# Altium footprint library cool_library.PcbLib: 1182 footprints (part 20 of 75)
Each footprint in its own frame and in the unit in brackets; x right, y up, seen from the top. Pads: shape width x height; smd on the part's side, far side on the other; paste and mask are expansions set on the pad; w line width, h text height; cw(c..) or ccw(c..) is an arc to the next point about the centre after c.
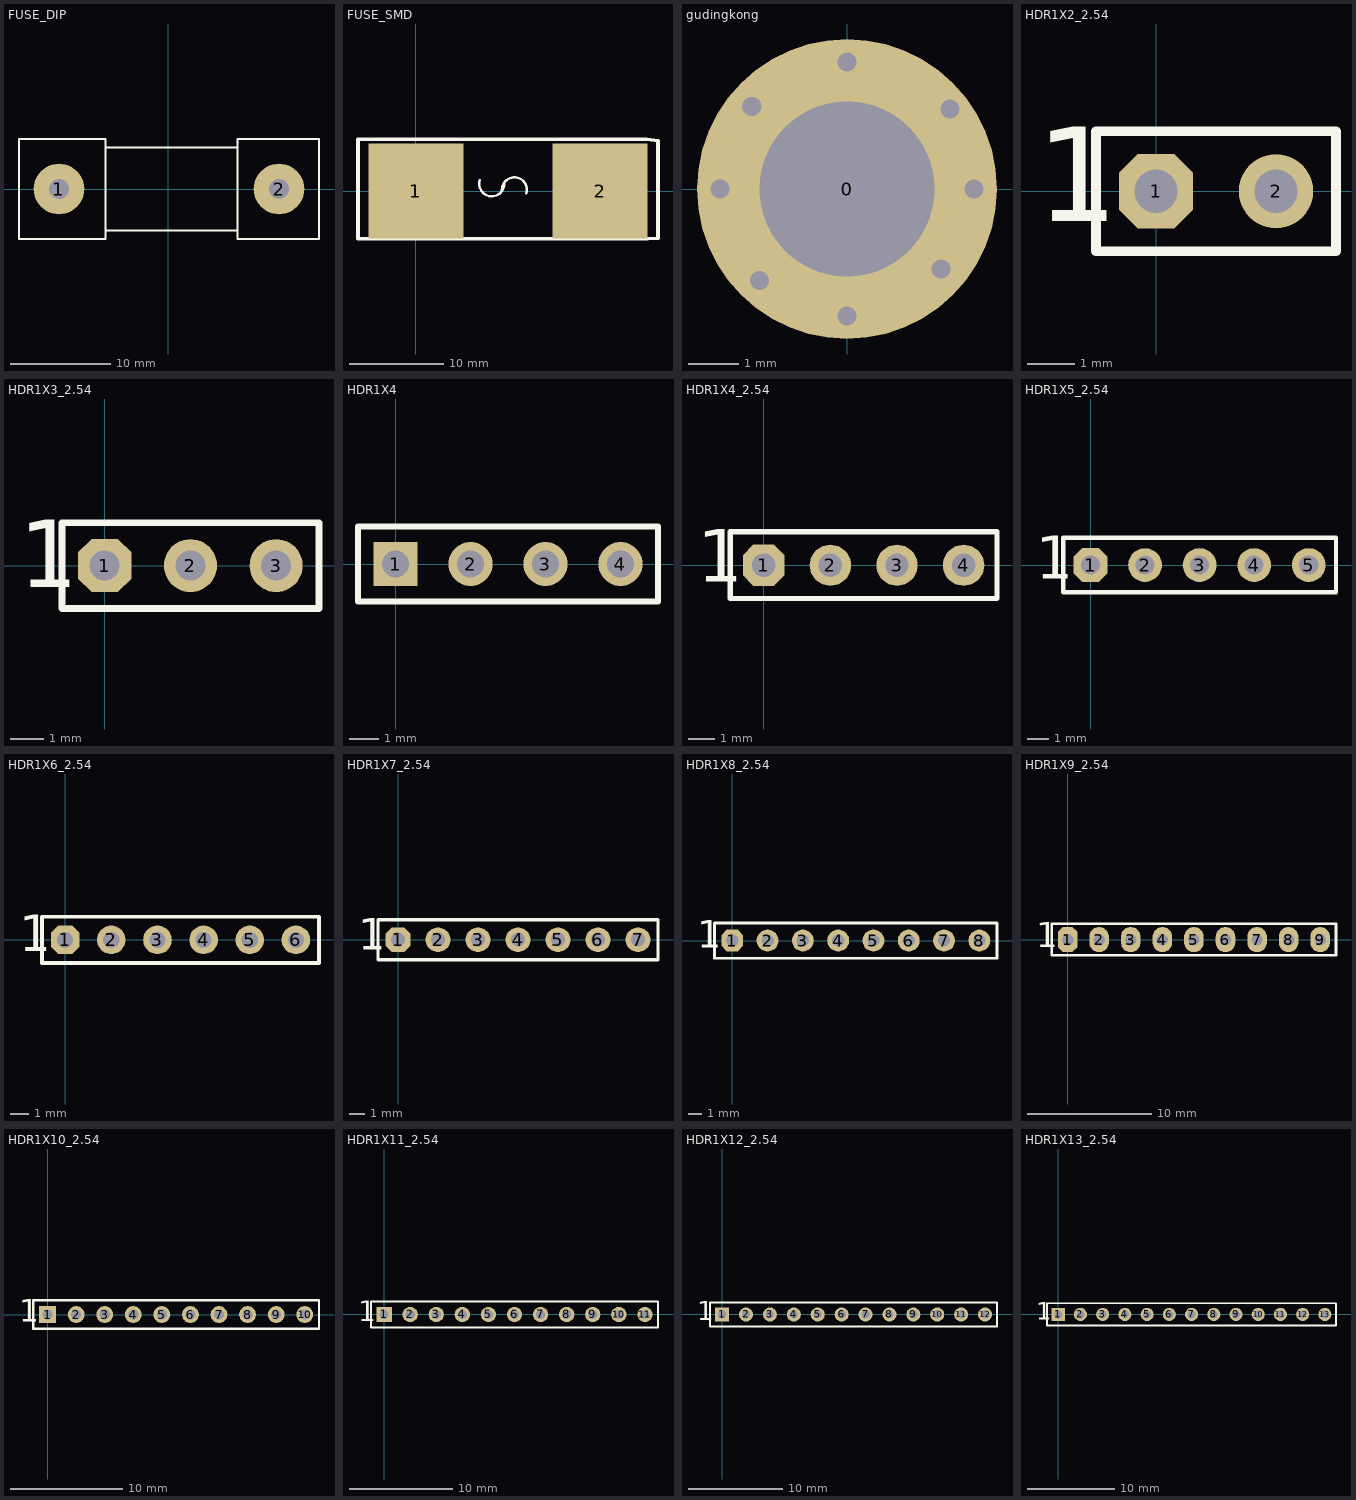
[diagram p19: the footprints below, top view; thin cyan lines are the x and y axes]

## FUSE_DIP [mm]
pads (2):
  round 5.08 hole 2: 1(-10.922,0) 2(11.078,0)
Top Overlay:
  lines w0.203: -6.286,-4.136 6.922,-4.136 ; -6.286,4.136 6.922,4.136 ; -14.922,-5 -6.286,-5 -6.286,5 -14.922,5 -14.922,-5 ; 6.922,-5 15.078,-5 15.078,5 6.922,5 6.922,-5

## FUSE_SMD [mm]
pads (2):
  rect 10x10 smd: 1(0,0) 2(19.431,0)
Top Overlay:
  lines w0.254: 6.734,1.149 ccw(c7.999,0.762) 9.322,0.762 ; 9.068,0.127 cw(c10.391,0.127) 11.656,-0.26
  lines w0.381: -6.121,5.461 24.384,5.461 25.552,5.309 25.552,-4.978 24.46,-5.055 -6.121,-5.055 -6.121,5.486

## gudingkong [mm]
pads (1):
  round 6 hole 3.5: 0(0,0)
via 0,2.54 diameter 0.762 hole 0.381
via 0,-2.54 diameter 0.762 hole 0.381
via -2.54,0 diameter 0.762 hole 0.381
via 2.54,0 diameter 0.762 hole 0.381
via -1.905,1.651 diameter 0.762 hole 0.381
via 2.057,1.6 diameter 0.762 hole 0.381
via -1.753,-1.829 diameter 0.762 hole 0.381
via 1.88,-1.6 diameter 0.762 hole 0.381

## HDR1X2_2.54 [mil]
pads (2):
  oct 62x62 hole 36: 1(0,0)
  round 62 hole 36: 2(100,0)
Top Overlay:
  lines w8: -50,-50 150,-50 150,50 -50,50 -50,-50
  text "1" at -100,-25 h78.74

## HDR1X3_2.54 [mil]
pads (3):
  oct 62x62 hole 35: 1(0,0)
  round 62 hole 35: 2(100,0) 3(200,0)
Top Overlay:
  lines w8: -50,-50 -50,50 250,50 250,-50 -50,-50
  text "1" at -100,-25 h78.74

## HDR1X4 [mm] "Connector; Header; 4 Position"
pads (4):
  rect 1.5x1.5 hole 0.9: 1(0,0)
  round 1.5 hole 0.9: 2(2.54,0) 3(5.08,0) 4(7.62,0)
Top Overlay:
  lines w0.2: -1.27,-1.27 -1.27,1.27 8.89,1.27 8.89,-1.27 -1.27,-1.27

## HDR1X4_2.54 [mil]
pads (4):
  oct 62x62 hole 35: 1(0,0)
  round 62 hole 35: 2(100,0) 3(200,0) 4(300,0)
Top Overlay:
  lines w8: -50,-50 -50,50 350,50 350,-50 -50,-50
  text "1" at -100,-25 h78.74

## HDR1X5_2.54 [mil]
pads (5):
  oct 62x62 hole 35: 1(0,0)
  round 62 hole 35: 2(100,0) 3(200,0) 4(300,0) 5(400,0)
Top Overlay:
  lines w8: -50,-50 -50,50 450,50 450,-50 -50,-50
  text "1" at -100,-25 h78.74

## HDR1X6_2.54 [mil]
pads (6):
  oct 62x62 hole 35: 1(0,0)
  round 62 hole 35: 2(100,0) 3(200,0) 4(300,0) 5(400,0) 6(500,0)
Top Overlay:
  lines w8: -50,-50 -50,50 550,50 550,-50 -50,-50
  text "1" at -100,-25 h78.74

## HDR1X7_2.54 [mil]
pads (7):
  oct 62x62 hole 35: 1(0,0)
  round 62 hole 35: 2(100,0) 3(200,0) 4(300,0) 5(400,0) 6(500,0) 7(600,0)
Top Overlay:
  lines w8: -50,-50 650,-50 650,50 -50,50 -50,-50
  text "1" at -100,-25 h78.74

## HDR1X8_2.54 [mil]
pads (8):
  oct 62x62 hole 35: 1(0,0)
  round 62 hole 35: 2(100,0) 3(200,0) 4(300,0) 5(400,0) 6(500,0) 7(600,0) 8(700,0)
Top Overlay:
  lines w8: -50,-50 750,-50 750,50 -50,50 -50,-50
  text "1" at -100,-20 h78.74

## HDR1X9_2.54 [mil]
pads (9):
  oct 62x80 hole 36: 1(0,0)
  oval 62x80 hole 36: 2(100,0) 3(200,0) 4(300,0) 5(400,0) 6(500,0) 7(600,0) 8(700,0) 9(800,0)
Top Overlay:
  lines w8: -50,-50 850,-50 850,50 -50,50 -50,-50
  text "1" at -100,-25 h78.74

## HDR1X10_2.54 [mm]
pads (10):
  rect 1.5x1.5 hole 0.9: 1(0,0)
  round 1.5 hole 0.9: 2(2.54,0) 3(5.08,0) 4(7.62,0) 5(10.16,0) 6(12.7,0) 7(15.24,0) 8(17.78,0) 9(20.32,0) 10(22.86,0)
Top Overlay:
  lines w0.2: -1.27,-1.27 -1.27,1.27 0.635,1.27 24.13,1.27 24.13,-1.27 -1.27,-1.27
  text "1" at -2.54,-0.635 h2

## HDR1X11_2.54 [mm]
pads (11):
  rect 1.5x1.5 hole 0.9: 1(0,0)
  round 1.5 hole 0.9: 2(2.54,0) 3(5.08,0) 4(7.62,0) 5(10.16,0) 6(12.7,0) 7(15.24,0) 8(17.78,0) 9(20.32,0) 10(22.86,0) 11(25.4,0)
Top Overlay:
  lines w0.2: -1.27,-1.27 -1.27,1.27 0.635,1.27 26.67,1.27 26.67,-1.27 -1.27,-1.27
  text "1" at -2.54,-0.635 h2

## HDR1X12_2.54 [mm]
pads (12):
  rect 1.5x1.5 hole 0.9: 1(0,0)
  round 1.5 hole 0.9: 2(2.54,0) 3(5.08,0) 4(7.62,0) 5(10.16,0) 6(12.7,0) 7(15.24,0) 8(17.78,0) 9(20.32,0) 10(22.86,0) 11(25.4,0) 12(27.94,0)
Top Overlay:
  lines w0.2: -1.27,-1.27 29.21,-1.27 29.21,1.27 0.635,1.27 -1.27,1.27 -1.27,-1.27
  text "1" at -2.667,-0.635 h2

## HDR1X13_2.54 [mm]
pads (13):
  rect 1.5x1.5 hole 0.9: 1(0,0)
  round 1.5 hole 0.9: 2(2.54,0) 3(5.08,0) 4(7.62,0) 5(10.16,0) 6(12.7,0) 7(15.24,0) 8(17.78,0) 9(20.32,0) 10(22.86,0) 11(25.4,0) 12(27.94,0) 13(30.48,0)
Top Overlay:
  lines w0.2: -1.27,-1.27 -1.27,1.27 0.635,1.27 31.75,1.27 31.75,-1.27 -1.27,-1.27
  text "1" at -2.54,-0.635 h2